# Altium footprint library lib_datalogger.PcbLib: 866 footprints (part 13 of 55)
Each footprint in its own frame and in the unit in brackets; x right, y up, seen from the top. Pads: shape width x height; smd on the part's side, far side on the other; paste and mask are expansions set on the pad; w line width, h text height; cw(c..) or ccw(c..) is an arc to the next point about the centre after c.
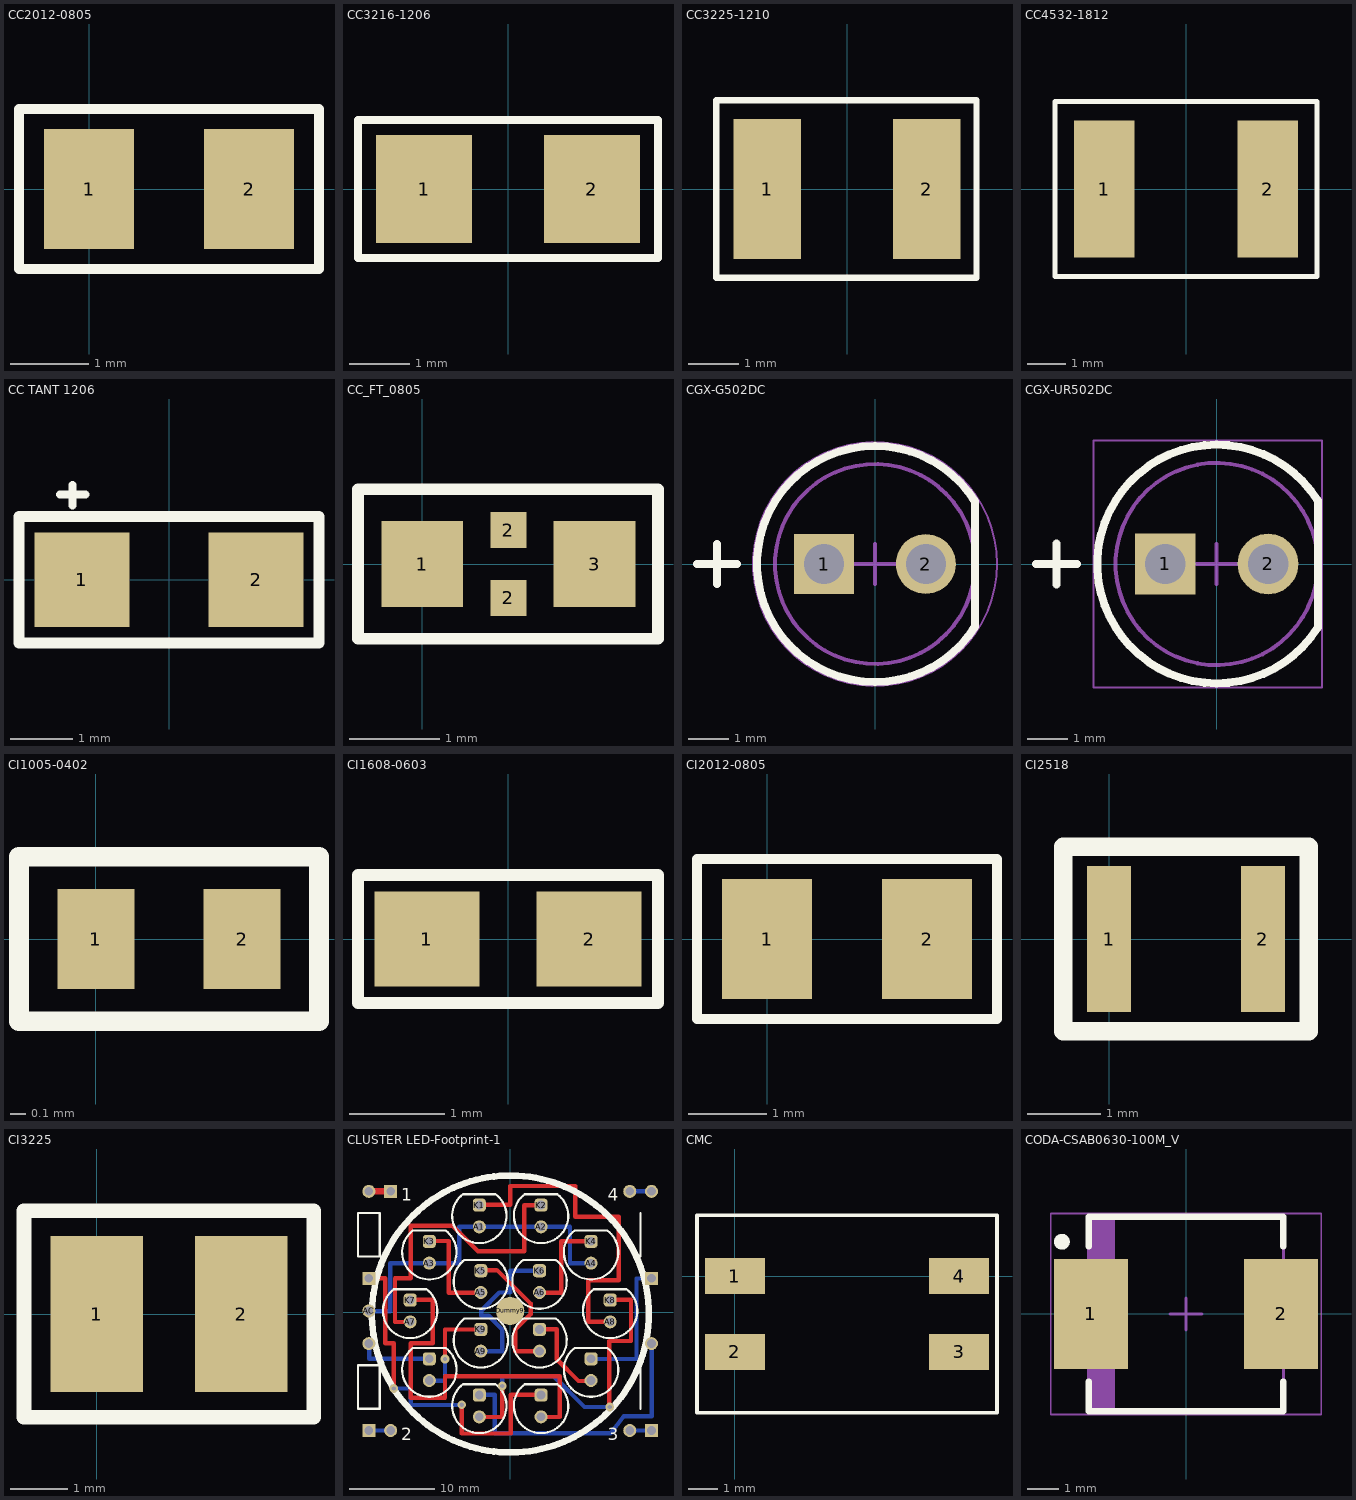
[diagram p12: the footprints below, top view; thin cyan lines are the x and y axes]

## CC2012-0805 [mil] "Chip Capacitor"
pads (2):
  rect 45x60 smd: 1(0,0) 2(80,0)
Top Overlay:
  lines w5: -35,-40 -35,40 115,40 115,-40 -35,-40
3D body "0805.step": height 23.62, standoff 0, extent 0.63,-24.6 79.37,24.6

## CC3216-1206 [mm] "Chip Capacitor; Body 3.2 x 1.6 mm (LxW typ)"
height 1.35
pads (2):
  rect 1.6x1.8 smd: 1(-1.4,0) 2(1.4,0)
Top Overlay:
  lines w0.127: -2.5,-1.15 -2.5,1.15 2.5,1.15 2.5,-1.15 -2.5,-1.15
3D body "3216.step": height 0.79, standoff 0.01, extent -1.6,-0.8 1.6,0.8

## CC3225-1210 [mm] "Chip Capacitor; Body 1.6 x 0.8 mm (LxW typ)"
pads (2):
  rect 1.35x2.8 smd: 1(-1.6,0) 2(1.6,0)
Top Overlay:
  lines w0.127: -2.616,-1.778 2.591,-1.778 2.591,1.778 -2.616,1.778 -2.616,-1.778
3D body "User Library-SMD CAPACITOR.step": height 0.77, standoff -0.01, extent -1.6,-1.25 1.6,1.25

## CC4532-1812 [mm] "Chip Capacitor"
pads (2):
  rect 1.6x3.6 smd: 1(-2.15,0) 2(2.15,0)
Top Overlay:
  lines w0.127: -3.45,-2.3 -3.45,2.3 3.45,2.3 3.45,-2.3 -3.45,-2.3
3D body "1812.step": height 1, standoff 0, extent -2.25,-1.6 2.25,1.6

## CC TANT 1206 [mil]
height 4
pads (2):
  rect 60x60 smd: 1(-55.12,0) 2(55.12,0)
Top Overlay:
  lines w5: -69,54 -53,54 ; -61,47 -61,60
  lines w7: -95,-40 95,-40 95,40 -95,40 -95,-40
3D body "User Library-Tantalum Cap Case A.step": height 63, standoff -0.03, extent -62.99,-31.5 62.99,31.5

## CC_FT_0805 [mm]
height 1
pads (4):
  rect 0.9x0.95 smd: 1(0,0) 3(1.9,0)
  rect 0.4x0.4 smd: 2(0.95,-0.375) 2(0.95,0.375)
Top Overlay:
  lines w0.127: -0.711,-0.826 -0.711,0.826 2.591,0.826 ; -0.701,-0.826 2.601,-0.826 2.601,0.826
3D body "YFF-4_1P0X0P55_18.stp": height 0.71, standoff 0, extent 0.099,-0.445 1.801,0.445

## CGX-G502DC [mm] "THD, 2-Leads, Dia 5.9mm, Pin Spacing 2.54mm"
height 9.1
pads (2):
  rect 1.5x1.5 hole 1: 1(-1.27,0)
  round 1.5 hole 1: 2(1.27,0)
Top Overlay:
  lines w0.2: -4.45,0 -3.45,0 ; -3.95,-0.5 -3.95,0.5 ; 2.5,1.566 ccw(c0,0) 2.5,-1.566 2.5,1.566
Mechanical 13:
  circle w0.1: c0,0 r2.5
  lines w0.1: 2.5,1.566 ccw(c0,0) 2.5,-1.566 2.5,1.566
Mechanical 15:
  circle w0.05: c0,0 r3.05
  lines w0.1: -0.5,0 0.5,0 ; 0,-0.5 0,0.5
3D body: height 0.5, standoff -16.5, extent 1.02,-0.25 1.52,0.25
3D body: height 0.5, standoff -18.5, extent -1.52,-0.25 -1.02,0.25
3D body: height 1.5, standoff 0.5, extent -2.95,-2.95 2.5,2.95
3D body: height 6.6, standoff 1.5, extent -2.5,-2.497 2.5,2.497
3D body: height 9.1, standoff 4.1, extent -2.489,-2.497 2.5,2.497

## CGX-UR502DC [mm] "THD, 2-Leads, Dia 5.9mm, Pin Spacing 2.54mm"
height 9.1
pads (2):
  rect 1.5x1.5 hole 1: 1(-1.27,0)
  round 1.5 hole 1: 2(1.27,0)
Top Overlay:
  lines w0.2: -4.466,0 -3.45,0 ; -3.958,-0.508 -3.958,-0.254 -3.958,0.254 -3.958,0.508 ; 2.5,1.566 ccw(c0,0) 2.5,-1.566 2.5,1.566
Mechanical 13:
  circle w0.1: c0,0 r2.5
  lines w0.1: 2.5,1.566 ccw(c0,0) 2.5,-1.566 2.5,1.566
Mechanical 15:
  lines w0.05: -3.05,-3.05 -3.05,3.05 2.6,3.05 2.6,-3.05 -3.05,-3.05
  lines w0.1: -0.5,0 0.5,0 ; 0,-0.5 0,0.5
3D body: height 0.5, standoff -16.5, extent 1.02,-0.25 1.52,0.25
3D body: height 0.5, standoff -18.5, extent -1.52,-0.25 -1.02,0.25
3D body: height 1.5, standoff 0.5, extent -2.95,-2.95 2.5,2.95
3D body: height 6.6, standoff 1.5, extent -2.5,-2.497 2.5,2.497
3D body: height 9.1, standoff 4.1, extent -2.489,-2.497 2.5,2.497

## CI1005-0402 [mm] "Chip Capacitor; Body 0.039\" L x 0.020\" W (1.00mm x 0.50mm)"
height 1.35
pads (2):
  rect 0.5x0.65 smd: 1(0,0) 2(0.95,0)
Top Overlay:
  lines w0.127: -0.5,-0.533 -0.5,0.533 1.45,0.533 1.45,-0.533 -0.5,-0.533
3D body "INDC1005-0402.STEP": height 0.5, standoff 0, extent -0.04,-0.25 0.96,0.25

## CI1608-0603 [mm] "Chip Inductor; Body 1.6 x 0.8 mm (LxW typ)"
height 1.35
pads (2):
  rect 1.1x1 smd: 1(-0.85,0) 2(0.85,0)
Top Overlay:
  lines w0.127: -1.571,-0.671 1.571,-0.671 1.571,0.671 -1.571,0.671 -1.571,-0.671
3D body "User Library-Chip Inductor.step": height 0.8, standoff 0, extent -0.8,-0.475 0.8,0.475

## CI2012-0805 [mil] "Chip Inductor"
pads (2):
  rect 45x60 smd: 1(0,0) 2(80,0)
Top Overlay:
  lines w5: -35,-40 -35,40 115,40 115,-40 -35,-40
3D body "User Library-ind_0805.step": height 37.4, standoff 0, extent 0.63,-23.62 79.37,23.62

## CI2518 [mm]
height 0.6
pads (2):
  rect 0.6x2 smd: 1(0,0) 2(2.1,0)
Top Overlay:
  lines w0.254: -0.63,-1.26 2.73,-1.26 2.73,1.26 -0.63,1.26 -0.63,-1.26
3D body "User Library-IND_1007.STEP": height 1.8, standoff 0, extent -0.2,-0.897 2.3,0.903

## CI3225 [mm]
height 0.6
pads (2):
  rect 1.6x2.7 smd: 1(0,0) 2(2.5,0)
Top Overlay:
  lines w0.254: -1.262,-1.789 3.759,-1.789 3.759,1.789 -1.262,1.789 -1.262,-1.767
3D body "LQH32CN.step": height 2, standoff 0, extent -0.353,-1.355 2.849,1.355

## CLUSTER LED-Footprint-1 [mil]
pads (42):
  round 60 hole 40: A1(-142,392) A2(142,392) A3(-372,225) A4(372,225) A5(-135,90) A6(135,90) A7(-460,-45) A8(460,-45) A9(-135,-180) A10(135,-180) A11(-372,-315) A12(372,-315) A13(-142,-482) A14(142,-482) AC(-650,5) Dummy2(-650,-145) Dummy4(-650,555) Dummy6(650,555) Dummy8(650,-145) KG2(-550,-545) KG3(550,-545) KG4(550,555)
  rect 60x60 hole 40: Dummy1(-650,-545) Dummy3(-650,155) Dummy5(650,155) Dummy7(650,-545) KG1(-550,555)
  round 130 all layers, no hole: Dummy9(0,5)
  rrect50% 60x60 hole 40: K1(-142,492) K2(142,492) K3(-372,325) K4(372,325) K5(-135,190) K6(135,190) K7(-460,55) K8(460,55) K9(-135,-80) K10(135,-80) K11(-372,-215) K12(372,-215) K13(-142,-382) K14(142,-382)
via 458,-437 diameter 40 hole 20
via -300,-216 diameter 40 hole 20
via -536,-352 diameter 40 hole 20
via -223,-427 diameter 40 hole 20
via -36,-340 diameter 40 hole 20
Top Layer:
  lines w20: -652,156 -575,156 -575,-144 -535,-144 -536,-352 ; -459,-46 -530,-46 -530,155 -458,155 -458,397 -265,397 -148,280 64,280 64,492 142,492 ; -458,57 -356,57 -356,-143 -457,-143 -457,-395 -300,-395 -300,-295 228,-295 228,-483 141,-483 ; -373,327 -282,327 -282,89 -135,89 ; -300,-216 -300,-80 -131,-80 ; -223,-427 -223,-559 3,-559 3,-380 145,-380 ; -142,-483 -36,-483 -36,-340 ; -142,493 0,493 0,580 300,580 300,438 500,438 500,147 359,147 359,-45 459,-45 ; -136,193 -61,193 94,39 94,-10 24,-80 24,-180 135,-180 ; 132,-176 132,-166 ; 135,-79 214,-79 214,-217 314,-317 373,-317 ; 135,89 235,89 235,325 373,325 ; 456,-433 456,-133 556,-133 556,56 456,56
  lines w30: -650,555 -550,555
Bottom Layer:
  lines w20: -652,4 -552,4 -552,225 -235,225 -235,392 275,392 275,225 375,225 ; -650,-545 -550,-545 ; -650,555 -550,555 ; -648,-144 -648,-215 -369,-215 ; -536,-352 -458,-351 -458,-428 -223,-427 ; -371,-316 -300,-316 -300,-216 ; -140,-380 -71,-380 -71,-558 462,-558 ; -135,-180 -36,-180 -36,-80 -99,-17 -133,-17 -133,6 -50,90 0,90 0,190 137,190 ; -36,-340 -36,-295 200,-295 342,-437 458,-437 ; 372,-216 581,-216 581,153 ; 463,-558 522,-479 651,-479 651,-149 ; 550,-545 650,-545 ; 550,555 650,555 ; 581,154 650,154
Top Overlay:
  circle w30: c1,-9 r637
  lines w10: -535.23,104.83 ccw(c-460,5) -384.77,104.83 ; -535,105 -385,105 ; -447.23,-165.17 ccw(c-372,-265) -296.77,-165.17 ; -447.23,374.83 ccw(c-372,275) -296.77,374.83 ; -447,-165 -297,-165 ; -447,375 -297,375 ; -217.23,-332.17 ccw(c-142,-432) -66.77,-332.17 ; -217.23,541.83 ccw(c-142,442) -66.77,541.83 ; -217,-332 -67,-332 ; -217,542 -67,542 ; -210.23,-30.17 ccw(c-135,-130) -59.77,-30.17 ; -210.23,239.83 ccw(c-135,140) -59.77,239.83 ; -210,-30 -60,-30 ; -210,240 -60,240 ; 59.77,-30.17 ccw(c135,-130) 210.23,-30.17 ; 59.77,239.83 ccw(c135,140) 210.23,239.83 ; 60,-30 210,-30 ; 60,240 210,240 ; 66.77,-332.17 ccw(c142,-432) 217.23,-332.17 ; 66.77,541.83 ccw(c142,442) 217.23,541.83 ; 67,-332 217,-332 ; 67,542 217,542 ; 296.77,-165.17 ccw(c372,-265) 447.23,-165.17 ; 296.77,374.83 ccw(c372,275) 447.23,374.83 ; 297,-165 447,-165 ; 297,375 447,375 ; 384.77,104.83 ccw(c460,5) 535.23,104.83 ; 385,105 535,105 ; 600,-445 600,-245 ; 600,255 600,455 ; -700,-445 -600,-445 -600,-245 -700,-245 -700,-445 ; -700,255 -700,455 -600,455 -600,255 -700,255
  text "1" at -500,511 h56.88
  text "2" at -500,-589 h56.88
  text "3" at 450,-589 h56.88
  text "4" at 450,511 h56.88
3D body "User Library-LED-3.STEP": height 334.65, standoff -118.11, extent -258.11,326.89 -21.89,543.43
3D body "User Library-LED-3.STEP": height 334.65, standoff -118.11, extent -258.11,-543.11 -21.89,-326.57
3D body "User Library-LED-3.STEP": height 334.65, standoff -118.11, extent -493.11,-378.11 -256.89,-161.57
3D body "User Library-LED-3.STEP": height 334.65, standoff -118.11, extent 251.89,-378.11 488.11,-161.57
3D body "User Library-LED-3.STEP": height 334.65, standoff -118.11, extent 26.89,326.89 263.11,543.43
3D body "User Library-LED-3.STEP": height 334.65, standoff -118.11, extent 341.89,-108.11 578.11,108.43
3D body "User Library-LED-3.STEP": height 334.65, standoff -118.11, extent 16.89,-243.11 253.11,-26.57
3D body "User Library-LED-3.STEP": height 334.65, standoff -118.11, extent -578.11,-108.11 -341.89,108.43
3D body "User Library-LED-3.STEP": height 334.65, standoff -118.11, extent -253.11,26.89 -16.89,243.43
3D body "User Library-LED-3.STEP": height 334.65, standoff -118.11, extent -253.11,-243.11 -16.89,-26.57
3D body "User Library-LED-3.STEP": height 334.65, standoff -118.11, extent 256.89,161.89 493.11,378.43
3D body "User Library-LED-3.STEP": height 334.65, standoff -118.11, extent 16.89,26.89 253.11,243.43
3D body "User Library-LED-3.STEP": height 334.65, standoff -118.11, extent -488.11,161.89 -251.89,378.43
3D body "User Library-LED-3.STEP": height 334.65, standoff -118.11, extent 26.89,-543.11 263.11,-326.57

## CMC [mm]
height 1
pads (4):
  rect 2x1.2 smd: 1(0,0) 2(0,-2.54) 3(7.5,-2.54) 4(7.5,0)
Top Overlay:
  lines w0.127: -1.27,-4.572 8.77,-4.572 8.77,2.032 -1.27,2.032 -1.27,-4.572
3D body "choke.stp": height 5, standoff 0, extent -0.85,-4.27 8.35,1.73

## CODA-CSAB0630-100M_V [mm] "Molded Inductor, 2-Leads, Body 6.2x6.2mm"
height 3
pads (2):
  rect 2.35x3.5 smd: 1(-3.025,0) 2(3.025,0)
Top Overlay:
  circle w0.25: c-3.95,2.3 r0.125
  lines w0.2: -3.1,-2.15 -3.1,-3.1 3.1,-3.1 3.1,-2.15 ; -3.1,2.15 -3.1,3.1 3.1,3.1 3.1,2.15
Mechanical 13:
  rectangle: -3.1,-3.1 -2.266,3.1
  lines w0.1: -3.1,-3.1 -3.1,3.1 3.1,3.1 3.1,-3.1 -3.1,-3.1
Mechanical 15:
  lines w0.05: -4.3,-3.2 -4.3,3.2 4.3,3.2 4.3,-3.2 -4.3,-3.2
  lines w0.1: -0.5,0 0.5,0 ; 0,-0.5 0,0.5
3D body "INDM6060X30L.step": height 3, standoff 0, extent -3.32,-3.1 3.32,3.1